# Altium footprint library Package_DFN_QFN.PcbLib: 557 footprints (part 19 of 35)
Each footprint in its own frame and in the unit in brackets; x right, y up, seen from the top. Pads: shape width x height; smd on the part's side, far side on the other; paste and mask are expansions set on the pad; w line width, h text height; cw(c..) or ccw(c..) is an arc to the next point about the centre after c.
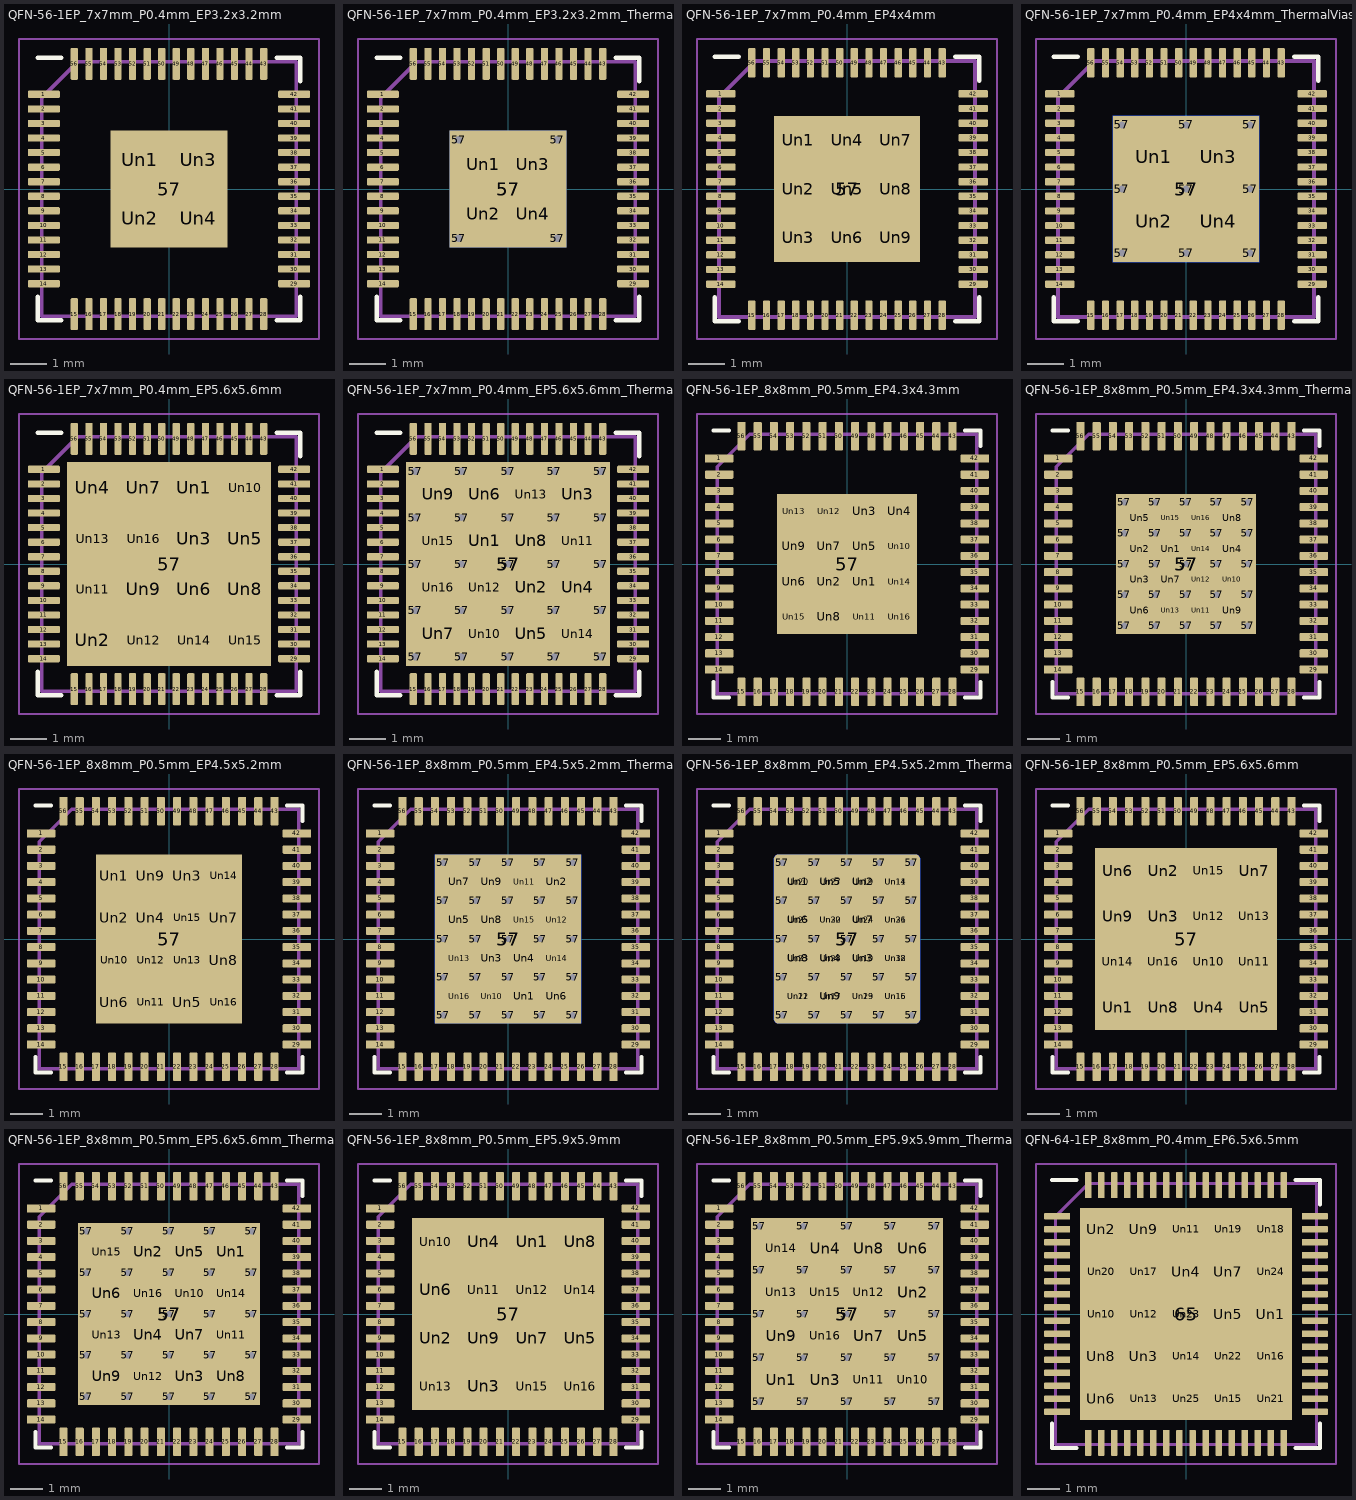
[diagram p18: the footprints below, top view; thin cyan lines are the x and y axes]

## QFN-56-1EP_7x7mm_P0.4mm_EP3.2x3.2mm [mm]
pads (61):
  rrect25% 0.875x0.2 smd: 1(-3.437,2.6) 2(-3.437,2.2) 3(-3.437,1.8) 4(-3.437,1.4) 5(-3.437,1) 6(-3.437,0.6) 7(-3.437,0.2) 8(-3.437,-0.2) 9(-3.437,-0.6) 10(-3.437,-1) 11(-3.437,-1.4) 12(-3.437,-1.8) 13(-3.437,-2.2) 14(-3.437,-2.6) 29(3.437,-2.6) 30(3.437,-2.2) 31(3.437,-1.8) 32(3.437,-1.4) 33(3.437,-1) 34(3.437,-0.6) 35(3.437,-0.2) 36(3.437,0.2) 37(3.437,0.6) 38(3.437,1) 39(3.437,1.4) 40(3.437,1.8) 41(3.437,2.2) 42(3.437,2.6)
  rrect25% 0.2x0.875 smd: 15(-2.6,-3.437) 16(-2.2,-3.437) 17(-1.8,-3.437) 18(-1.4,-3.437) 19(-1,-3.437) 20(-0.6,-3.437) 21(-0.2,-3.437) 22(0.2,-3.437) 23(0.6,-3.437) 24(1,-3.437) 25(1.4,-3.437) 26(1.8,-3.437) 27(2.2,-3.437) 28(2.6,-3.437) 43(2.6,3.437) 44(2.2,3.437) 45(1.8,3.437) 46(1.4,3.437) 47(1,3.437) 48(0.6,3.437) 49(0.2,3.437) 50(-0.2,3.437) 51(-0.6,3.437) 52(-1,3.437) 53(-1.4,3.437) 54(-1.8,3.437) 55(-2.2,3.437) 56(-2.6,3.437)
  rect 3.2x3.2 smd: 57(0,0)
  rrect19% 1.29x1.29 on Top Paste: Un1(-0.8,0.8) Un2(-0.8,-0.8) Un3(0.8,0.8) Un4(0.8,-0.8)
F.SilkS:
  lines w0.12: -3.61,-2.96 -3.61,-3.61 -2.96,-3.61 ; -3.61,3.61 -2.96,3.61 ; 2.96,-3.61 3.61,-3.61 3.61,-2.96 ; 2.96,3.61 3.61,3.61 3.61,2.96
F.CrtYd:
  lines w0.05: -4.12,-4.12 -4.12,4.12 4.12,4.12 4.12,-4.12 -4.12,-4.12
F.Fab:
  lines w0.1: -3.5,-3.5 3.5,-3.5 3.5,3.5 -2.5,3.5 -3.5,2.5 -3.5,-3.5
  text "'.Designator'" at -4.047,-0.84 h1

## QFN-56-1EP_7x7mm_P0.4mm_EP3.2x3.2mm_ThermalVias [mm]
pads (66):
  rrect25% 0.875x0.2 smd: 1(-3.437,2.6) 2(-3.437,2.2) 3(-3.437,1.8) 4(-3.437,1.4) 5(-3.437,1) 6(-3.437,0.6) 7(-3.437,0.2) 8(-3.437,-0.2) 9(-3.437,-0.6) 10(-3.437,-1) 11(-3.437,-1.4) 12(-3.437,-1.8) 13(-3.437,-2.2) 14(-3.437,-2.6) 29(3.437,-2.6) 30(3.437,-2.2) 31(3.437,-1.8) 32(3.437,-1.4) 33(3.437,-1) 34(3.437,-0.6) 35(3.437,-0.2) 36(3.437,0.2) 37(3.437,0.6) 38(3.437,1) 39(3.437,1.4) 40(3.437,1.8) 41(3.437,2.2) 42(3.437,2.6)
  rrect25% 0.2x0.875 smd: 15(-2.6,-3.437) 16(-2.2,-3.437) 17(-1.8,-3.437) 18(-1.4,-3.437) 19(-1,-3.437) 20(-0.6,-3.437) 21(-0.2,-3.437) 22(0.2,-3.437) 23(0.6,-3.437) 24(1,-3.437) 25(1.4,-3.437) 26(1.8,-3.437) 27(2.2,-3.437) 28(2.6,-3.437) 43(2.6,3.437) 44(2.2,3.437) 45(1.8,3.437) 46(1.4,3.437) 47(1,3.437) 48(0.6,3.437) 49(0.2,3.437) 50(-0.2,3.437) 51(-0.6,3.437) 52(-1,3.437) 53(-1.4,3.437) 54(-1.8,3.437) 55(-2.2,3.437) 56(-2.6,3.437)
  round 0.5 hole 0.2: 57(-1.35,-1.35) 57(-1.35,1.35) 57(1.35,-1.35) 57(1.35,1.35)
  rect 3.2x3.2 smd: 57(0,0)
  rect 3.2x3.2 smd far side: 57(0,0)
  round 1.118 on Top Paste: Un1(-0.675,0.675) Un2(-0.675,-0.675) Un3(0.675,0.675) Un4(0.675,-0.675)
F.SilkS:
  lines w0.12: -3.61,-2.96 -3.61,-3.61 -2.96,-3.61 ; -3.61,3.61 -2.96,3.61 ; 2.96,-3.61 3.61,-3.61 3.61,-2.96 ; 2.96,3.61 3.61,3.61 3.61,2.96
F.Paste:
  region: -0.177,0.177 -1.173,0.177 -1.173,1.072 -1.072,1.173 -0.177,1.173
  region: -0.177,-1.173 -1.072,-1.173 -1.173,-1.072 -1.173,-0.177 -0.177,-0.177
  region: 1.173,1.072 1.173,0.177 0.177,0.177 0.177,1.173 1.072,1.173
  region: 1.173,-1.072 1.072,-1.173 0.177,-1.173 0.177,-0.177 1.173,-0.177
F.CrtYd:
  lines w0.05: -4.12,-4.12 -4.12,4.12 4.12,4.12 4.12,-4.12 -4.12,-4.12
F.Fab:
  lines w0.1: -3.5,-3.5 3.5,-3.5 3.5,3.5 -2.5,3.5 -3.5,2.5 -3.5,-3.5
  text "'.Designator'" at -4.047,-0.84 h1

## QFN-56-1EP_7x7mm_P0.4mm_EP4x4mm [mm]
pads (66):
  rrect25% 0.8x0.2 smd: 1(-3.45,2.6) 2(-3.45,2.2) 3(-3.45,1.8) 4(-3.45,1.4) 5(-3.45,1) 6(-3.45,0.6) 7(-3.45,0.2) 8(-3.45,-0.2) 9(-3.45,-0.6) 10(-3.45,-1) 11(-3.45,-1.4) 12(-3.45,-1.8) 13(-3.45,-2.2) 14(-3.45,-2.6) 29(3.45,-2.6) 30(3.45,-2.2) 31(3.45,-1.8) 32(3.45,-1.4) 33(3.45,-1) 34(3.45,-0.6) 35(3.45,-0.2) 36(3.45,0.2) 37(3.45,0.6) 38(3.45,1) 39(3.45,1.4) 40(3.45,1.8) 41(3.45,2.2) 42(3.45,2.6)
  rrect25% 0.2x0.8 smd: 15(-2.6,-3.45) 16(-2.2,-3.45) 17(-1.8,-3.45) 18(-1.4,-3.45) 19(-1,-3.45) 20(-0.6,-3.45) 21(-0.2,-3.45) 22(0.2,-3.45) 23(0.6,-3.45) 24(1,-3.45) 25(1.4,-3.45) 26(1.8,-3.45) 27(2.2,-3.45) 28(2.6,-3.45) 43(2.6,3.45) 44(2.2,3.45) 45(1.8,3.45) 46(1.4,3.45) 47(1,3.45) 48(0.6,3.45) 49(0.2,3.45) 50(-0.2,3.45) 51(-0.6,3.45) 52(-1,3.45) 53(-1.4,3.45) 54(-1.8,3.45) 55(-2.2,3.45) 56(-2.6,3.45)
  rect 4x4 smd: 57(0,0)
  rrect23% 1.07x1.07 on Top Paste: Un1(-1.33,1.33) Un2(-1.33,0) Un3(-1.33,-1.33) Un4(0,1.33) Un5(0,0) Un6(0,-1.33) Un7(1.33,1.33) Un8(1.33,0) Un9(1.33,-1.33)
F.SilkS:
  lines w0.12: -3.61,-2.96 -3.61,-3.61 -2.96,-3.61 ; -3.61,3.61 -2.96,3.61 ; 2.96,-3.61 3.61,-3.61 3.61,-2.96 ; 2.96,3.61 3.61,3.61 3.61,2.96
F.CrtYd:
  lines w0.05: -4.1,-4.1 -4.1,4.1 4.1,4.1 4.1,-4.1 -4.1,-4.1
F.Fab:
  lines w0.1: -3.5,-3.5 3.5,-3.5 3.5,3.5 -2.5,3.5 -3.5,2.5 -3.5,-3.5
  text "'.Designator'" at -4.047,-0.84 h1

## QFN-56-1EP_7x7mm_P0.4mm_EP4x4mm_ThermalVias [mm]
pads (71):
  rrect25% 0.8x0.2 smd: 1(-3.45,2.6) 2(-3.45,2.2) 3(-3.45,1.8) 4(-3.45,1.4) 5(-3.45,1) 6(-3.45,0.6) 7(-3.45,0.2) 8(-3.45,-0.2) 9(-3.45,-0.6) 10(-3.45,-1) 11(-3.45,-1.4) 12(-3.45,-1.8) 13(-3.45,-2.2) 14(-3.45,-2.6) 29(3.45,-2.6) 30(3.45,-2.2) 31(3.45,-1.8) 32(3.45,-1.4) 33(3.45,-1) 34(3.45,-0.6) 35(3.45,-0.2) 36(3.45,0.2) 37(3.45,0.6) 38(3.45,1) 39(3.45,1.4) 40(3.45,1.8) 41(3.45,2.2) 42(3.45,2.6)
  rrect25% 0.2x0.8 smd: 15(-2.6,-3.45) 16(-2.2,-3.45) 17(-1.8,-3.45) 18(-1.4,-3.45) 19(-1,-3.45) 20(-0.6,-3.45) 21(-0.2,-3.45) 22(0.2,-3.45) 23(0.6,-3.45) 24(1,-3.45) 25(1.4,-3.45) 26(1.8,-3.45) 27(2.2,-3.45) 28(2.6,-3.45) 43(2.6,3.45) 44(2.2,3.45) 45(1.8,3.45) 46(1.4,3.45) 47(1,3.45) 48(0.6,3.45) 49(0.2,3.45) 50(-0.2,3.45) 51(-0.6,3.45) 52(-1,3.45) 53(-1.4,3.45) 54(-1.8,3.45) 55(-2.2,3.45) 56(-2.6,3.45)
  round 0.5 hole 0.2: 57(-1.75,-1.75) 57(-1.75,0) 57(-1.75,1.75) 57(0,-1.75) 57(0,0) 57(0,1.75) 57(1.75,-1.75) 57(1.75,0) 57(1.75,1.75)
  rect 4x4 smd: 57(0,0)
  rect 4x4 smd far side: 57(0,0)
  rrect16% 1.549x1.549 on Top Paste: Un1(-0.875,0.875) Un2(-0.875,-0.875) Un3(0.875,0.875) Un4(0.875,-0.875)
F.SilkS:
  lines w0.12: -3.61,-2.96 -3.61,-3.61 -2.96,-3.61 ; -3.61,3.61 -2.96,3.61 ; 2.96,-3.61 3.61,-3.61 3.61,-2.96 ; 2.96,3.61 3.61,3.61 3.61,2.96
F.CrtYd:
  lines w0.05: -4.1,-4.1 -4.1,4.1 4.1,4.1 4.1,-4.1 -4.1,-4.1
F.Fab:
  lines w0.1: -3.5,-3.5 3.5,-3.5 3.5,3.5 -2.5,3.5 -3.5,2.5 -3.5,-3.5
  text "'.Designator'" at -4.047,-0.84 h1

## QFN-56-1EP_7x7mm_P0.4mm_EP5.6x5.6mm [mm]
pads (73):
  rrect25% 0.875x0.2 smd: 1(-3.437,2.6) 2(-3.437,2.2) 3(-3.437,1.8) 4(-3.437,1.4) 5(-3.437,1) 6(-3.437,0.6) 7(-3.437,0.2) 8(-3.437,-0.2) 9(-3.437,-0.6) 10(-3.437,-1) 11(-3.437,-1.4) 12(-3.437,-1.8) 13(-3.437,-2.2) 14(-3.437,-2.6) 29(3.437,-2.6) 30(3.437,-2.2) 31(3.437,-1.8) 32(3.437,-1.4) 33(3.437,-1) 34(3.437,-0.6) 35(3.437,-0.2) 36(3.437,0.2) 37(3.437,0.6) 38(3.437,1) 39(3.437,1.4) 40(3.437,1.8) 41(3.437,2.2) 42(3.437,2.6)
  rrect25% 0.2x0.875 smd: 15(-2.6,-3.437) 16(-2.2,-3.437) 17(-1.8,-3.437) 18(-1.4,-3.437) 19(-1,-3.437) 20(-0.6,-3.437) 21(-0.2,-3.437) 22(0.2,-3.437) 23(0.6,-3.437) 24(1,-3.437) 25(1.4,-3.437) 26(1.8,-3.437) 27(2.2,-3.437) 28(2.6,-3.437) 43(2.6,3.437) 44(2.2,3.437) 45(1.8,3.437) 46(1.4,3.437) 47(1,3.437) 48(0.6,3.437) 49(0.2,3.437) 50(-0.2,3.437) 51(-0.6,3.437) 52(-1,3.437) 53(-1.4,3.437) 54(-1.8,3.437) 55(-2.2,3.437) 56(-2.6,3.437)
  rect 5.6x5.6 smd: 57(0,0)
  rrect22% 1.13x1.13 on Top Paste: Un1(0.7,2.1) Un2(-2.1,-2.1) Un3(0.7,0.7) Un4(-2.1,2.1) Un5(2.1,0.7) Un6(0.7,-0.7) Un7(-0.7,2.1) Un8(2.1,-0.7) Un9(-0.7,-0.7) Un10(2.1,2.1) Un11(-2.1,-0.7) Un12(-0.7,-2.1) Un13(-2.1,0.7) Un14(0.7,-2.1) Un15(2.1,-2.1) Un16(-0.7,0.7)
F.SilkS:
  lines w0.12: -3.61,-2.96 -3.61,-3.61 -2.96,-3.61 ; -3.61,3.61 -2.96,3.61 ; 2.96,-3.61 3.61,-3.61 3.61,-2.96 ; 2.96,3.61 3.61,3.61 3.61,2.96
F.CrtYd:
  lines w0.05: -4.12,-4.12 4.12,-4.12 4.12,4.12 -4.12,4.12 -4.12,-4.12
F.Fab:
  lines w0.1: -3.5,-3.5 3.5,-3.5 3.5,3.5 -2.5,3.5 -3.5,2.5 -3.5,-3.5
  text "'.Designator'" at -4.047,-0.84 h1

## QFN-56-1EP_7x7mm_P0.4mm_EP5.6x5.6mm_ThermalVias [mm]
pads (99):
  rrect25% 0.875x0.2 smd: 1(-3.437,2.6) 2(-3.437,2.2) 3(-3.437,1.8) 4(-3.437,1.4) 5(-3.437,1) 6(-3.437,0.6) 7(-3.437,0.2) 8(-3.437,-0.2) 9(-3.437,-0.6) 10(-3.437,-1) 11(-3.437,-1.4) 12(-3.437,-1.8) 13(-3.437,-2.2) 14(-3.437,-2.6) 29(3.437,-2.6) 30(3.437,-2.2) 31(3.437,-1.8) 32(3.437,-1.4) 33(3.437,-1) 34(3.437,-0.6) 35(3.437,-0.2) 36(3.437,0.2) 37(3.437,0.6) 38(3.437,1) 39(3.437,1.4) 40(3.437,1.8) 41(3.437,2.2) 42(3.437,2.6)
  rrect25% 0.2x0.875 smd: 15(-2.6,-3.437) 16(-2.2,-3.437) 17(-1.8,-3.437) 18(-1.4,-3.437) 19(-1,-3.437) 20(-0.6,-3.437) 21(-0.2,-3.437) 22(0.2,-3.437) 23(0.6,-3.437) 24(1,-3.437) 25(1.4,-3.437) 26(1.8,-3.437) 27(2.2,-3.437) 28(2.6,-3.437) 43(2.6,3.437) 44(2.2,3.437) 45(1.8,3.437) 46(1.4,3.437) 47(1,3.437) 48(0.6,3.437) 49(0.2,3.437) 50(-0.2,3.437) 51(-0.6,3.437) 52(-1,3.437) 53(-1.4,3.437) 54(-1.8,3.437) 55(-2.2,3.437) 56(-2.6,3.437)
  round 0.5 hole 0.2: 57(-2.55,-2.55) 57(-2.55,-1.275) 57(-2.55,0) 57(-2.55,1.275) 57(-2.55,2.55) 57(-1.275,-2.55) 57(-1.275,-1.275) 57(-1.275,0) 57(-1.275,1.275) 57(-1.275,2.55) 57(0,-2.55) 57(0,-1.275) 57(0,0) 57(0,1.275) 57(0,2.55) 57(1.275,-2.55) 57(1.275,-1.275) 57(1.275,0) 57(1.275,1.275) 57(1.275,2.55) 57(2.55,-2.55) 57(2.55,-1.275) 57(2.55,0) 57(2.55,1.275) 57(2.55,2.55)
  rect 5.6x5.6 smd far side: 57(0,0)
  rect 5.6x5.6 smd: 57(0,0)
  rrect23% 1.084x1.084 on Top Paste: Un1(-0.637,0.637) Un2(0.637,-0.637) Un3(1.913,1.913) Un4(1.913,-0.637) Un5(0.637,-1.913) Un6(-0.637,1.913) Un7(-1.913,-1.913) Un8(0.637,0.637) Un9(-1.913,1.913) Un10(-0.637,-1.913) Un11(1.913,0.637) Un12(-0.637,-0.637) Un13(0.637,1.913) Un14(1.913,-1.913) Un15(-1.913,0.637) Un16(-1.913,-0.637)
F.SilkS:
  lines w0.12: -3.61,-2.96 -3.61,-3.61 -2.96,-3.61 ; -3.61,3.61 -2.96,3.61 ; 2.96,-3.61 3.61,-3.61 3.61,-2.96 ; 2.96,3.61 3.61,3.61 3.61,2.96
F.CrtYd:
  lines w0.05: -4.12,-4.12 -4.12,4.12 4.12,4.12 4.12,-4.12 -4.12,-4.12
F.Fab:
  lines w0.1: -3.5,-3.5 3.5,-3.5 3.5,3.5 -2.5,3.5 -3.5,2.5 -3.5,-3.5
  text "'.Designator'" at -4.047,-0.84 h1

## QFN-56-1EP_8x8mm_P0.5mm_EP4.3x4.3mm [mm]
pads (73):
  rrect25% 0.875x0.25 smd: 1(-3.938,3.25) 2(-3.938,2.75) 3(-3.938,2.25) 4(-3.938,1.75) 5(-3.938,1.25) 6(-3.938,0.75) 7(-3.938,0.25) 8(-3.938,-0.25) 9(-3.938,-0.75) 10(-3.938,-1.25) 11(-3.938,-1.75) 12(-3.938,-2.25) 13(-3.938,-2.75) 14(-3.938,-3.25) 29(3.938,-3.25) 30(3.938,-2.75) 31(3.938,-2.25) 32(3.938,-1.75) 33(3.938,-1.25) 34(3.938,-0.75) 35(3.938,-0.25) 36(3.938,0.25) 37(3.938,0.75) 38(3.938,1.25) 39(3.938,1.75) 40(3.938,2.25) 41(3.938,2.75) 42(3.938,3.25)
  rrect25% 0.25x0.875 smd: 15(-3.25,-3.938) 16(-2.75,-3.938) 17(-2.25,-3.938) 18(-1.75,-3.938) 19(-1.25,-3.938) 20(-0.75,-3.938) 21(-0.25,-3.938) 22(0.25,-3.938) 23(0.75,-3.938) 24(1.25,-3.938) 25(1.75,-3.938) 26(2.25,-3.938) 27(2.75,-3.938) 28(3.25,-3.938) 43(3.25,3.938) 44(2.75,3.938) 45(2.25,3.938) 46(1.75,3.938) 47(1.25,3.938) 48(0.75,3.938) 49(0.25,3.938) 50(-0.25,3.938) 51(-0.75,3.938) 52(-1.25,3.938) 53(-1.75,3.938) 54(-2.25,3.938) 55(-2.75,3.938) 56(-3.25,3.938)
  rect 4.3x4.3 smd: 57(0,0)
  rrect25% 0.87x0.87 on Top Paste: Un1(0.54,-0.54) Un2(-0.54,-0.54) Un3(0.54,1.62) Un4(1.62,1.62) Un5(0.54,0.54) Un6(-1.62,-0.54) Un7(-0.54,0.54) Un8(-0.54,-1.62) Un9(-1.62,0.54) Un10(1.62,0.54) Un11(0.54,-1.62) Un12(-0.54,1.62) Un13(-1.62,1.62) Un14(1.62,-0.54) Un15(-1.62,-1.62) Un16(1.62,-1.62)
F.SilkS:
  lines w0.12: -4.11,-3.635 -4.11,-4.11 -3.635,-4.11 ; -4.11,4.11 -3.635,4.11 ; 3.635,-4.11 4.11,-4.11 4.11,-3.635 ; 3.635,4.11 4.11,4.11 4.11,3.635
F.CrtYd:
  lines w0.05: -4.62,-4.62 4.62,-4.62 4.62,4.62 -4.62,4.62 -4.62,-4.62
F.Fab:
  lines w0.1: -4,-4 4,-4 4,4 -3,4 -4,3 -4,-4
  text "'.Designator'" at -4.047,-0.84 h1

## QFN-56-1EP_8x8mm_P0.5mm_EP4.3x4.3mm_ThermalVias [mm]
pads (99):
  rrect25% 0.875x0.25 smd: 1(-3.938,3.25) 2(-3.938,2.75) 3(-3.938,2.25) 4(-3.938,1.75) 5(-3.938,1.25) 6(-3.938,0.75) 7(-3.938,0.25) 8(-3.938,-0.25) 9(-3.938,-0.75) 10(-3.938,-1.25) 11(-3.938,-1.75) 12(-3.938,-2.25) 13(-3.938,-2.75) 14(-3.938,-3.25) 29(3.938,-3.25) 30(3.938,-2.75) 31(3.938,-2.25) 32(3.938,-1.75) 33(3.938,-1.25) 34(3.938,-0.75) 35(3.938,-0.25) 36(3.938,0.25) 37(3.938,0.75) 38(3.938,1.25) 39(3.938,1.75) 40(3.938,2.25) 41(3.938,2.75) 42(3.938,3.25)
  rrect25% 0.25x0.875 smd: 15(-3.25,-3.938) 16(-2.75,-3.938) 17(-2.25,-3.938) 18(-1.75,-3.938) 19(-1.25,-3.938) 20(-0.75,-3.938) 21(-0.25,-3.938) 22(0.25,-3.938) 23(0.75,-3.938) 24(1.25,-3.938) 25(1.75,-3.938) 26(2.25,-3.938) 27(2.75,-3.938) 28(3.25,-3.938) 43(3.25,3.938) 44(2.75,3.938) 45(2.25,3.938) 46(1.75,3.938) 47(1.25,3.938) 48(0.75,3.938) 49(0.25,3.938) 50(-0.25,3.938) 51(-0.75,3.938) 52(-1.25,3.938) 53(-1.75,3.938) 54(-2.25,3.938) 55(-2.75,3.938) 56(-3.25,3.938)
  round 0.5 hole 0.2: 57(-1.9,-1.9) 57(-1.9,-0.95) 57(-1.9,0) 57(-1.9,0.95) 57(-1.9,1.9) 57(-0.95,-1.9) 57(-0.95,-0.95) 57(-0.95,0) 57(-0.95,0.95) 57(-0.95,1.9) 57(0,-1.9) 57(0,-0.95) 57(0,0) 57(0,0.95) 57(0,1.9) 57(0.95,-1.9) 57(0.95,-0.95) 57(0.95,0) 57(0.95,0.95) 57(0.95,1.9) 57(1.9,-1.9) 57(1.9,-0.95) 57(1.9,0) 57(1.9,0.95) 57(1.9,1.9)
  rect 4.3x4.3 smd far side: 57(0,0)
  rect 4.3x4.3 smd: 57(0,0)
  round 0.716 on Top Paste: Un1(-0.475,0.475) Un2(-1.425,0.475) Un3(-1.425,-0.475) Un4(1.425,0.475) Un5(-1.425,1.425) Un6(-1.425,-1.425) Un7(-0.475,-0.475) Un8(1.425,1.425) Un9(1.425,-1.425) Un10(1.425,-0.475) Un11(0.475,-1.425) Un12(0.475,-0.475) Un13(-0.475,-1.425) Un14(0.475,0.475) Un15(-0.475,1.425) Un16(0.475,1.425)
F.SilkS:
  lines w0.12: -4.11,-3.635 -4.11,-4.11 -3.635,-4.11 ; -4.11,4.11 -3.635,4.11 ; 3.635,-4.11 4.11,-4.11 4.11,-3.635 ; 3.635,4.11 4.11,4.11 4.11,3.635
F.Paste:
  region: -0.176,0.677 -0.176,0.273 -0.273,0.176 -0.677,0.176 -0.774,0.273 -0.774,0.677 -0.677,0.774 -0.273,0.774
  region: -1.126,0.677 -1.126,0.273 -1.223,0.176 -1.627,0.176 -1.724,0.273 -1.724,0.677 -1.627,0.774 -1.223,0.774
  region: -1.126,-0.273 -1.126,-0.677 -1.223,-0.774 -1.627,-0.774 -1.724,-0.677 -1.724,-0.273 -1.627,-0.176 -1.223,-0.176
  region: 1.724,0.677 1.724,0.273 1.627,0.176 1.223,0.176 1.126,0.273 1.126,0.677 1.223,0.774 1.627,0.774
  region: -1.126,1.627 -1.126,1.223 -1.223,1.126 -1.627,1.126 -1.724,1.223 -1.724,1.627 -1.627,1.724 -1.223,1.724
  region: -1.126,-1.223 -1.126,-1.627 -1.223,-1.724 -1.627,-1.724 -1.724,-1.627 -1.724,-1.223 -1.627,-1.126 -1.223,-1.126
  region: -0.176,-0.273 -0.176,-0.677 -0.273,-0.774 -0.677,-0.774 -0.774,-0.677 -0.774,-0.273 -0.677,-0.176 -0.273,-0.176
  region: 1.724,1.627 1.724,1.223 1.627,1.126 1.223,1.126 1.126,1.223 1.126,1.627 1.223,1.724 1.627,1.724
  region: 1.724,-1.223 1.724,-1.627 1.627,-1.724 1.223,-1.724 1.126,-1.627 1.126,-1.223 1.223,-1.126 1.627,-1.126
  region: 1.724,-0.273 1.724,-0.677 1.627,-0.774 1.223,-0.774 1.126,-0.677 1.126,-0.273 1.223,-0.176 1.627,-0.176
  region: 0.774,-1.223 0.774,-1.627 0.677,-1.724 0.273,-1.724 0.176,-1.627 0.176,-1.223 0.273,-1.126 0.677,-1.126
  region: 0.774,-0.273 0.774,-0.677 0.677,-0.774 0.273,-0.774 0.176,-0.677 0.176,-0.273 0.273,-0.176 0.677,-0.176
  region: -0.176,-1.223 -0.176,-1.627 -0.273,-1.724 -0.677,-1.724 -0.774,-1.627 -0.774,-1.223 -0.677,-1.126 -0.273,-1.126
  region: 0.774,0.677 0.774,0.273 0.677,0.176 0.273,0.176 0.176,0.273 0.176,0.677 0.273,0.774 0.677,0.774
  region: -0.176,1.627 -0.176,1.223 -0.273,1.126 -0.677,1.126 -0.774,1.223 -0.774,1.627 -0.677,1.724 -0.273,1.724
  region: 0.774,1.627 0.774,1.223 0.677,1.126 0.273,1.126 0.176,1.223 0.176,1.627 0.273,1.724 0.677,1.724
F.CrtYd:
  lines w0.05: -4.62,-4.62 -4.62,4.62 4.62,4.62 4.62,-4.62 -4.62,-4.62
F.Fab:
  lines w0.1: -4,-4 -4,3 -3,4 4,4 4,-4 -4,-4
  text "'.Designator'" at -4.047,-0.84 h1

## QFN-56-1EP_8x8mm_P0.5mm_EP4.5x5.2mm [mm]
pads (73):
  rrect25% 0.875x0.25 smd: 1(-3.938,3.25) 2(-3.938,2.75) 3(-3.938,2.25) 4(-3.938,1.75) 5(-3.938,1.25) 6(-3.938,0.75) 7(-3.938,0.25) 8(-3.938,-0.25) 9(-3.938,-0.75) 10(-3.938,-1.25) 11(-3.938,-1.75) 12(-3.938,-2.25) 13(-3.938,-2.75) 14(-3.938,-3.25) 29(3.938,-3.25) 30(3.938,-2.75) 31(3.938,-2.25) 32(3.938,-1.75) 33(3.938,-1.25) 34(3.938,-0.75) 35(3.938,-0.25) 36(3.938,0.25) 37(3.938,0.75) 38(3.938,1.25) 39(3.938,1.75) 40(3.938,2.25) 41(3.938,2.75) 42(3.938,3.25)
  rrect25% 0.25x0.875 smd: 15(-3.25,-3.938) 16(-2.75,-3.938) 17(-2.25,-3.938) 18(-1.75,-3.938) 19(-1.25,-3.938) 20(-0.75,-3.938) 21(-0.25,-3.938) 22(0.25,-3.938) 23(0.75,-3.938) 24(1.25,-3.938) 25(1.75,-3.938) 26(2.25,-3.938) 27(2.75,-3.938) 28(3.25,-3.938) 43(3.25,3.938) 44(2.75,3.938) 45(2.25,3.938) 46(1.75,3.938) 47(1.25,3.938) 48(0.75,3.938) 49(0.25,3.938) 50(-0.25,3.938) 51(-0.75,3.938) 52(-1.25,3.938) 53(-1.75,3.938) 54(-2.25,3.938) 55(-2.75,3.938) 56(-3.25,3.938)
  rect 4.5x5.2 smd: 57(0,0)
  rrect25% 0.91x1.05 on Top Paste: Un1(-1.68,1.95) Un2(-1.68,0.65) Un3(0.56,1.95) Un4(-0.56,0.65) Un5(0.56,-1.95) Un6(-1.68,-1.95) Un7(1.68,0.65) Un8(1.68,-0.65) Un9(-0.56,1.95) Un10(-1.68,-0.65) Un11(-0.56,-1.95) Un12(-0.56,-0.65) Un13(0.56,-0.65) Un14(1.68,1.95) Un15(0.56,0.65) Un16(1.68,-1.95)
F.SilkS:
  lines w0.12: -4.11,-3.635 -4.11,-4.11 -3.635,-4.11 ; -4.11,4.11 -3.635,4.11 ; 3.635,-4.11 4.11,-4.11 4.11,-3.635 ; 3.635,4.11 4.11,4.11 4.11,3.635
F.CrtYd:
  lines w0.05: -4.62,-4.62 -4.62,4.62 4.62,4.62 4.62,-4.62 -4.62,-4.62
F.Fab:
  lines w0.1: -4,-4 -4,3 -3,4 4,4 4,-4 -4,-4
  text "'.Designator'" at -4.047,-0.84 h1

## QFN-56-1EP_8x8mm_P0.5mm_EP4.5x5.2mm_ThermalVias [mm]
pads (99):
  rrect25% 0.875x0.25 smd: 1(-3.938,3.25) 2(-3.938,2.75) 3(-3.938,2.25) 4(-3.938,1.75) 5(-3.938,1.25) 6(-3.938,0.75) 7(-3.938,0.25) 8(-3.938,-0.25) 9(-3.938,-0.75) 10(-3.938,-1.25) 11(-3.938,-1.75) 12(-3.938,-2.25) 13(-3.938,-2.75) 14(-3.938,-3.25) 29(3.938,-3.25) 30(3.938,-2.75) 31(3.938,-2.25) 32(3.938,-1.75) 33(3.938,-1.25) 34(3.938,-0.75) 35(3.938,-0.25) 36(3.938,0.25) 37(3.938,0.75) 38(3.938,1.25) 39(3.938,1.75) 40(3.938,2.25) 41(3.938,2.75) 42(3.938,3.25)
  rrect25% 0.25x0.875 smd: 15(-3.25,-3.938) 16(-2.75,-3.938) 17(-2.25,-3.938) 18(-1.75,-3.938) 19(-1.25,-3.938) 20(-0.75,-3.938) 21(-0.25,-3.938) 22(0.25,-3.938) 23(0.75,-3.938) 24(1.25,-3.938) 25(1.75,-3.938) 26(2.25,-3.938) 27(2.75,-3.938) 28(3.25,-3.938) 43(3.25,3.938) 44(2.75,3.938) 45(2.25,3.938) 46(1.75,3.938) 47(1.25,3.938) 48(0.75,3.938) 49(0.25,3.938) 50(-0.25,3.938) 51(-0.75,3.938) 52(-1.25,3.938) 53(-1.75,3.938) 54(-2.25,3.938) 55(-2.75,3.938) 56(-3.25,3.938)
  round 0.5 hole 0.2: 57(-2,-2.35) 57(-2,-1.175) 57(-2,0) 57(-2,1.175) 57(-2,2.35) 57(-1,-2.35) 57(-1,-1.175) 57(-1,0) 57(-1,1.175) 57(-1,2.35) 57(0,-2.35) 57(0,-1.175) 57(0,0) 57(0,1.175) 57(0,2.35) 57(1,-2.35) 57(1,-1.175) 57(1,0) 57(1,1.175) 57(1,2.35) 57(2,-2.35) 57(2,-1.175) 57(2,0) 57(2,1.175) 57(2,2.35)
  rect 4.5x5.2 smd far side: 57(0,0)
  rect 4.5x5.2 smd: 57(0,0)
  round 0.776 on Top Paste: Un1(0.5,-1.763) Un2(1.5,1.763) Un3(-0.5,-0.587) Un4(0.5,-0.587) Un5(-1.5,0.587) Un6(1.5,-1.763) Un7(-1.5,1.763) Un8(-0.5,0.587) Un9(-0.5,1.763) Un10(-0.5,-1.763) Un11(0.5,1.763) Un12(1.5,0.587) Un13(-1.5,-0.587) Un14(1.5,-0.587) Un15(0.5,0.587) Un16(-1.5,-1.763)
F.SilkS:
  lines w0.12: -4.11,-3.635 -4.11,-4.11 -3.635,-4.11 ; -4.11,4.11 -3.635,4.11 ; 3.635,-4.11 4.11,-4.11 4.11,-3.635 ; 3.635,4.11 4.11,4.11 4.11,3.635
F.Paste:
  region: 0.841,-1.433 0.841,-2.092 0.762,-2.171 0.238,-2.171 0.159,-2.092 0.159,-1.433 0.238,-1.354 0.762,-1.354
  region: 1.841,2.092 1.841,1.433 1.762,1.354 1.238,1.354 1.159,1.433 1.159,2.092 1.238,2.171 1.762,2.171
  region: -0.159,-0.258 -0.159,-0.917 -0.238,-0.996 -0.762,-0.996 -0.841,-0.917 -0.841,-0.258 -0.762,-0.179 -0.238,-0.179
  region: 0.841,-0.258 0.841,-0.917 0.762,-0.996 0.238,-0.996 0.159,-0.917 0.159,-0.258 0.238,-0.179 0.762,-0.179
  region: -1.159,0.917 -1.159,0.258 -1.238,0.179 -1.762,0.179 -1.841,0.258 -1.841,0.917 -1.762,0.996 -1.238,0.996
  region: 1.841,-1.433 1.841,-2.092 1.762,-2.171 1.238,-2.171 1.159,-2.092 1.159,-1.433 1.238,-1.354 1.762,-1.354
  region: -1.159,2.092 -1.159,1.433 -1.238,1.354 -1.762,1.354 -1.841,1.433 -1.841,2.092 -1.762,2.171 -1.238,2.171
  region: -0.159,0.917 -0.159,0.258 -0.238,0.179 -0.762,0.179 -0.841,0.258 -0.841,0.917 -0.762,0.996 -0.238,0.996
  region: -0.159,2.092 -0.159,1.433 -0.238,1.354 -0.762,1.354 -0.841,1.433 -0.841,2.092 -0.762,2.171 -0.238,2.171
  region: -0.159,-1.433 -0.159,-2.092 -0.238,-2.171 -0.762,-2.171 -0.841,-2.092 -0.841,-1.433 -0.762,-1.354 -0.238,-1.354
  region: 0.841,2.092 0.841,1.433 0.762,1.354 0.238,1.354 0.159,1.433 0.159,2.092 0.238,2.171 0.762,2.171
  region: 1.841,0.917 1.841,0.258 1.762,0.179 1.238,0.179 1.159,0.258 1.159,0.917 1.238,0.996 1.762,0.996
  region: -1.159,-0.258 -1.159,-0.917 -1.238,-0.996 -1.762,-0.996 -1.841,-0.917 -1.841,-0.258 -1.762,-0.179 -1.238,-0.179
  region: 1.841,-0.258 1.841,-0.917 1.762,-0.996 1.238,-0.996 1.159,-0.917 1.159,-0.258 1.238,-0.179 1.762,-0.179
  region: 0.841,0.917 0.841,0.258 0.762,0.179 0.238,0.179 0.159,0.258 0.159,0.917 0.238,0.996 0.762,0.996
  region: -1.159,-1.433 -1.159,-2.092 -1.238,-2.171 -1.762,-2.171 -1.841,-2.092 -1.841,-1.433 -1.762,-1.354 -1.238,-1.354
F.CrtYd:
  lines w0.05: -4.62,-4.62 4.62,-4.62 4.62,4.62 -4.62,4.62 -4.62,-4.62
F.Fab:
  lines w0.1: -4,-4 -4,3 -3,4 4,4 4,-4 -4,-4
  text "'.Designator'" at -4.047,-0.84 h1

## QFN-56-1EP_8x8mm_P0.5mm_EP4.5x5.2mm_ThermalVias_TopTented [mm]
pads (115):
  rrect25% 0.875x0.25 smd: 1(-3.938,3.25) 2(-3.938,2.75) 3(-3.938,2.25) 4(-3.938,1.75) 5(-3.938,1.25) 6(-3.938,0.75) 7(-3.938,0.25) 8(-3.938,-0.25) 9(-3.938,-0.75) 10(-3.938,-1.25) 11(-3.938,-1.75) 12(-3.938,-2.25) 13(-3.938,-2.75) 14(-3.938,-3.25) 29(3.938,-3.25) 30(3.938,-2.75) 31(3.938,-2.25) 32(3.938,-1.75) 33(3.938,-1.25) 34(3.938,-0.75) 35(3.938,-0.25) 36(3.938,0.25) 37(3.938,0.75) 38(3.938,1.25) 39(3.938,1.75) 40(3.938,2.25) 41(3.938,2.75) 42(3.938,3.25)
  rrect25% 0.25x0.875 smd: 15(-3.25,-3.938) 16(-2.75,-3.938) 17(-2.25,-3.938) 18(-1.75,-3.938) 19(-1.25,-3.938) 20(-0.75,-3.938) 21(-0.25,-3.938) 22(0.25,-3.938) 23(0.75,-3.938) 24(1.25,-3.938) 25(1.75,-3.938) 26(2.25,-3.938) 27(2.75,-3.938) 28(3.25,-3.938) 43(3.25,3.938) 44(2.75,3.938) 45(2.25,3.938) 46(1.75,3.938) 47(1.25,3.938) 48(0.75,3.938) 49(0.25,3.938) 50(-0.25,3.938) 51(-0.75,3.938) 52(-1.25,3.938) 53(-1.75,3.938) 54(-2.25,3.938) 55(-2.75,3.938) 56(-3.25,3.938)
  round 0.5 hole 0.2: 57(-2,-2.35) 57(-2,-1.175) 57(-2,0) 57(-2,1.175) 57(-2,2.35) 57(-1,-2.35) 57(-1,-1.175) 57(-1,0) 57(-1,1.175) 57(-1,2.35) 57(0,-2.35) 57(0,-1.175) 57(0,0) 57(0,1.175) 57(0,2.35) 57(1,-2.35) 57(1,-1.175) 57(1,0) 57(1,1.175) 57(1,2.35) 57(2,-2.35) 57(2,-1.175) 57(2,0) 57(2,1.175) 57(2,2.35)
  rrect6% 4.5x5.2 smd: 57(0,0)
  rrect6% 4.5x5.2 smd far side: 57(0,0)
  round 0.776 on Top Paste: Un1(-1.5,1.763) Un2(0.5,1.763) Un3(0.5,-0.587) Un4(-0.5,-0.587) Un5(-0.5,1.763) Un6(-1.5,0.587) Un7(0.5,0.587) Un9(-0.5,-1.763) Un12(-1.5,-1.763) Un14(1.5,1.763) Un16(1.5,-1.763) Un18(1.5,-0.587) Un23(-1.5,-0.587) Un29(0.5,-1.763) Un30(-0.5,0.587) Un31(1.5,0.587)
  round 0.776 on Top Solder: Un8(-1.5,-0.587) Un10(0.5,-0.587) Un11(1.5,1.763) Un13(0.5,-1.763) Un15(1.5,-1.763) Un17(-0.5,-1.763) Un19(0.5,1.763) Un20(-1.5,1.763) Un21(-1.5,-1.763) Un22(-0.5,0.587) Un24(0.5,0.587) Un25(-1.5,0.587) Un26(1.5,0.587) Un27(-0.5,1.763) Un28(-0.5,-0.587) Un32(1.5,-0.587)
F.SilkS:
  lines w0.12: -4.11,-3.635 -4.11,-4.11 -3.635,-4.11 ; -4.11,4.11 -3.635,4.11 ; 3.635,-4.11 4.11,-4.11 4.11,-3.635 ; 3.635,4.11 4.11,4.11 4.11,3.635
F.Paste:
  region: -1.065,2.12 -1.065,1.405 -1.21,1.26 -1.79,1.26 -1.935,1.405 -1.935,2.12 -1.79,2.265 -1.21,2.265
  region: 0.935,2.12 0.935,1.405 0.79,1.26 0.21,1.26 0.065,1.405 0.065,2.12 0.21,2.265 0.79,2.265
  region: 0.935,-0.23 0.935,-0.945 0.79,-1.09 0.21,-1.09 0.065,-0.945 0.065,-0.23 0.21,-0.085 0.79,-0.085
  region: -0.065,-0.23 -0.065,-0.945 -0.21,-1.09 -0.79,-1.09 -0.935,-0.945 -0.935,-0.23 -0.79,-0.085 -0.21,-0.085
  region: -0.065,2.12 -0.065,1.405 -0.21,1.26 -0.79,1.26 -0.935,1.405 -0.935,2.12 -0.79,2.265 -0.21,2.265
  region: -1.065,0.945 -1.065,0.23 -1.21,0.085 -1.79,0.085 -1.935,0.23 -1.935,0.945 -1.79,1.09 -1.21,1.09
  region: 0.935,0.945 0.935,0.23 0.79,0.085 0.21,0.085 0.065,0.23 0.065,0.945 0.21,1.09 0.79,1.09
  region: -0.065,-1.405 -0.065,-2.12 -0.21,-2.265 -0.79,-2.265 -0.935,-2.12 -0.935,-1.405 -0.79,-1.26 -0.21,-1.26
  region: -1.065,-1.405 -1.065,-2.12 -1.21,-2.265 -1.79,-2.265 -1.935,-2.12 -1.935,-1.405 -1.79,-1.26 -1.21,-1.26
  region: 1.935,2.12 1.935,1.405 1.79,1.26 1.21,1.26 1.065,1.405 1.065,2.12 1.21,2.265 1.79,2.265
  region: 1.935,-1.405 1.935,-2.12 1.79,-2.265 1.21,-2.265 1.065,-2.12 1.065,-1.405 1.21,-1.26 1.79,-1.26
  region: 1.935,-0.23 1.935,-0.945 1.79,-1.09 1.21,-1.09 1.065,-0.945 1.065,-0.23 1.21,-0.085 1.79,-0.085
  region: -1.065,-0.23 -1.065,-0.945 -1.21,-1.09 -1.79,-1.09 -1.935,-0.945 -1.935,-0.23 -1.79,-0.085 -1.21,-0.085
  region: 0.935,-1.405 0.935,-2.12 0.79,-2.265 0.21,-2.265 0.065,-2.12 0.065,-1.405 0.21,-1.26 0.79,-1.26
  region: -0.065,0.945 -0.065,0.23 -0.21,0.085 -0.79,0.085 -0.935,0.23 -0.935,0.945 -0.79,1.09 -0.21,1.09
  region: 1.935,0.945 1.935,0.23 1.79,0.085 1.21,0.085 1.065,0.23 1.065,0.945 1.21,1.09 1.79,1.09
F.Mask:
  drawing of 80 lines, arcs and shapes, not listed
F.CrtYd:
  lines w0.05: -4.62,-4.62 -4.62,4.62 4.62,4.62 4.62,-4.62 -4.62,-4.62
F.Fab:
  lines w0.1: -4,-4 4,-4 4,4 -3,4 -4,3 -4,-4
  text "'.Designator'" at -4.047,-0.84 h1

## QFN-56-1EP_8x8mm_P0.5mm_EP5.6x5.6mm [mm]
pads (73):
  rrect25% 0.875x0.25 smd: 1(-3.938,3.25) 2(-3.938,2.75) 3(-3.938,2.25) 4(-3.938,1.75) 5(-3.938,1.25) 6(-3.938,0.75) 7(-3.938,0.25) 8(-3.938,-0.25) 9(-3.938,-0.75) 10(-3.938,-1.25) 11(-3.938,-1.75) 12(-3.938,-2.25) 13(-3.938,-2.75) 14(-3.938,-3.25) 29(3.938,-3.25) 30(3.938,-2.75) 31(3.938,-2.25) 32(3.938,-1.75) 33(3.938,-1.25) 34(3.938,-0.75) 35(3.938,-0.25) 36(3.938,0.25) 37(3.938,0.75) 38(3.938,1.25) 39(3.938,1.75) 40(3.938,2.25) 41(3.938,2.75) 42(3.938,3.25)
  rrect25% 0.25x0.875 smd: 15(-3.25,-3.938) 16(-2.75,-3.938) 17(-2.25,-3.938) 18(-1.75,-3.938) 19(-1.25,-3.938) 20(-0.75,-3.938) 21(-0.25,-3.938) 22(0.25,-3.938) 23(0.75,-3.938) 24(1.25,-3.938) 25(1.75,-3.938) 26(2.25,-3.938) 27(2.75,-3.938) 28(3.25,-3.938) 43(3.25,3.938) 44(2.75,3.938) 45(2.25,3.938) 46(1.75,3.938) 47(1.25,3.938) 48(0.75,3.938) 49(0.25,3.938) 50(-0.25,3.938) 51(-0.75,3.938) 52(-1.25,3.938) 53(-1.75,3.938) 54(-2.25,3.938) 55(-2.75,3.938) 56(-3.25,3.938)
  rect 5.6x5.6 smd: 57(0,0)
  rrect22% 1.13x1.13 on Top Paste: Un1(-2.1,-2.1) Un2(-0.7,2.1) Un3(-0.7,0.7) Un4(0.7,-2.1) Un5(2.1,-2.1) Un6(-2.1,2.1) Un7(2.1,2.1) Un8(-0.7,-2.1) Un9(-2.1,0.7) Un10(0.7,-0.7) Un11(2.1,-0.7) Un12(0.7,0.7) Un13(2.1,0.7) Un14(-2.1,-0.7) Un15(0.7,2.1) Un16(-0.7,-0.7)
F.SilkS:
  lines w0.12: -4.11,-3.635 -4.11,-4.11 -3.635,-4.11 ; -4.11,4.11 -3.635,4.11 ; 3.635,-4.11 4.11,-4.11 4.11,-3.635 ; 3.635,4.11 4.11,4.11 4.11,3.635
F.CrtYd:
  lines w0.05: -4.62,-4.62 -4.62,4.62 4.62,4.62 4.62,-4.62 -4.62,-4.62
F.Fab:
  lines w0.1: -4,-4 4,-4 4,4 -3,4 -4,3 -4,-4
  text "'.Designator'" at -4.047,-0.84 h1

## QFN-56-1EP_8x8mm_P0.5mm_EP5.6x5.6mm_ThermalVias [mm]
pads (99):
  rrect25% 0.875x0.25 smd: 1(-3.938,3.25) 2(-3.938,2.75) 3(-3.938,2.25) 4(-3.938,1.75) 5(-3.938,1.25) 6(-3.938,0.75) 7(-3.938,0.25) 8(-3.938,-0.25) 9(-3.938,-0.75) 10(-3.938,-1.25) 11(-3.938,-1.75) 12(-3.938,-2.25) 13(-3.938,-2.75) 14(-3.938,-3.25) 29(3.938,-3.25) 30(3.938,-2.75) 31(3.938,-2.25) 32(3.938,-1.75) 33(3.938,-1.25) 34(3.938,-0.75) 35(3.938,-0.25) 36(3.938,0.25) 37(3.938,0.75) 38(3.938,1.25) 39(3.938,1.75) 40(3.938,2.25) 41(3.938,2.75) 42(3.938,3.25)
  rrect25% 0.25x0.875 smd: 15(-3.25,-3.938) 16(-2.75,-3.938) 17(-2.25,-3.938) 18(-1.75,-3.938) 19(-1.25,-3.938) 20(-0.75,-3.938) 21(-0.25,-3.938) 22(0.25,-3.938) 23(0.75,-3.938) 24(1.25,-3.938) 25(1.75,-3.938) 26(2.25,-3.938) 27(2.75,-3.938) 28(3.25,-3.938) 43(3.25,3.938) 44(2.75,3.938) 45(2.25,3.938) 46(1.75,3.938) 47(1.25,3.938) 48(0.75,3.938) 49(0.25,3.938) 50(-0.25,3.938) 51(-0.75,3.938) 52(-1.25,3.938) 53(-1.75,3.938) 54(-2.25,3.938) 55(-2.75,3.938) 56(-3.25,3.938)
  round 0.5 hole 0.2: 57(-2.55,-2.55) 57(-2.55,-1.275) 57(-2.55,0) 57(-2.55,1.275) 57(-2.55,2.55) 57(-1.275,-2.55) 57(-1.275,-1.275) 57(-1.275,0) 57(-1.275,1.275) 57(-1.275,2.55) 57(0,-2.55) 57(0,-1.275) 57(0,0) 57(0,1.275) 57(0,2.55) 57(1.275,-2.55) 57(1.275,-1.275) 57(1.275,0) 57(1.275,1.275) 57(1.275,2.55) 57(2.55,-2.55) 57(2.55,-1.275) 57(2.55,0) 57(2.55,1.275) 57(2.55,2.55)
  rect 5.6x5.6 smd: 57(0,0)
  rect 5.6x5.6 smd far side: 57(0,0)
  rrect23% 1.084x1.084 on Top Paste: Un1(1.913,1.913) Un2(-0.637,1.913) Un3(0.637,-1.913) Un4(-0.637,-0.637) Un5(0.637,1.913) Un6(-1.913,0.637) Un7(0.637,-0.637) Un8(1.913,-1.913) Un9(-1.913,-1.913) Un10(0.637,0.637) Un11(1.913,-0.637) Un12(-0.637,-1.913) Un13(-1.913,-0.637) Un14(1.913,0.637) Un15(-1.913,1.913) Un16(-0.637,0.637)
F.SilkS:
  lines w0.12: -4.11,-3.635 -4.11,-4.11 -3.635,-4.11 ; -4.11,4.11 -3.635,4.11 ; 3.635,-4.11 4.11,-4.11 4.11,-3.635 ; 3.635,4.11 4.11,4.11 4.11,3.635
F.CrtYd:
  lines w0.05: -4.62,-4.62 4.62,-4.62 4.62,4.62 -4.62,4.62 -4.62,-4.62
F.Fab:
  lines w0.1: -4,-4 -4,3 -3,4 4,4 4,-4 -4,-4
  text "'.Designator'" at -4.047,-0.84 h1

## QFN-56-1EP_8x8mm_P0.5mm_EP5.9x5.9mm [mm]
pads (73):
  rrect25% 0.875x0.25 smd: 1(-3.938,3.25) 2(-3.938,2.75) 3(-3.938,2.25) 4(-3.938,1.75) 5(-3.938,1.25) 6(-3.938,0.75) 7(-3.938,0.25) 8(-3.938,-0.25) 9(-3.938,-0.75) 10(-3.938,-1.25) 11(-3.938,-1.75) 12(-3.938,-2.25) 13(-3.938,-2.75) 14(-3.938,-3.25) 29(3.938,-3.25) 30(3.938,-2.75) 31(3.938,-2.25) 32(3.938,-1.75) 33(3.938,-1.25) 34(3.938,-0.75) 35(3.938,-0.25) 36(3.938,0.25) 37(3.938,0.75) 38(3.938,1.25) 39(3.938,1.75) 40(3.938,2.25) 41(3.938,2.75) 42(3.938,3.25)
  rrect25% 0.25x0.875 smd: 15(-3.25,-3.938) 16(-2.75,-3.938) 17(-2.25,-3.938) 18(-1.75,-3.938) 19(-1.25,-3.938) 20(-0.75,-3.938) 21(-0.25,-3.938) 22(0.25,-3.938) 23(0.75,-3.938) 24(1.25,-3.938) 25(1.75,-3.938) 26(2.25,-3.938) 27(2.75,-3.938) 28(3.25,-3.938) 43(3.25,3.938) 44(2.75,3.938) 45(2.25,3.938) 46(1.75,3.938) 47(1.25,3.938) 48(0.75,3.938) 49(0.25,3.938) 50(-0.25,3.938) 51(-0.75,3.938) 52(-1.25,3.938) 53(-1.75,3.938) 54(-2.25,3.938) 55(-2.75,3.938) 56(-3.25,3.938)
  rect 5.9x5.9 smd: 57(0,0)
  rrect21% 1.19x1.19 on Top Paste: Un1(0.74,2.22) Un2(-2.22,-0.74) Un3(-0.74,-2.22) Un4(-0.74,2.22) Un5(2.22,-0.74) Un6(-2.22,0.74) Un7(0.74,-0.74) Un8(2.22,2.22) Un9(-0.74,-0.74) Un10(-2.22,2.22) Un11(-0.74,0.74) Un12(0.74,0.74) Un13(-2.22,-2.22) Un14(2.22,0.74) Un15(0.74,-2.22) Un16(2.22,-2.22)
F.SilkS:
  lines w0.12: -4.11,-3.635 -4.11,-4.11 -3.635,-4.11 ; -4.11,4.11 -3.635,4.11 ; 3.635,-4.11 4.11,-4.11 4.11,-3.635 ; 3.635,4.11 4.11,4.11 4.11,3.635
F.CrtYd:
  lines w0.05: -4.62,-4.62 4.62,-4.62 4.62,4.62 -4.62,4.62 -4.62,-4.62
F.Fab:
  lines w0.1: -4,-4 4,-4 4,4 -3,4 -4,3 -4,-4
  text "'.Designator'" at -4.047,-0.84 h1

## QFN-56-1EP_8x8mm_P0.5mm_EP5.9x5.9mm_ThermalVias [mm]
pads (99):
  rrect25% 0.875x0.25 smd: 1(-3.938,3.25) 2(-3.938,2.75) 3(-3.938,2.25) 4(-3.938,1.75) 5(-3.938,1.25) 6(-3.938,0.75) 7(-3.938,0.25) 8(-3.938,-0.25) 9(-3.938,-0.75) 10(-3.938,-1.25) 11(-3.938,-1.75) 12(-3.938,-2.25) 13(-3.938,-2.75) 14(-3.938,-3.25) 29(3.938,-3.25) 30(3.938,-2.75) 31(3.938,-2.25) 32(3.938,-1.75) 33(3.938,-1.25) 34(3.938,-0.75) 35(3.938,-0.25) 36(3.938,0.25) 37(3.938,0.75) 38(3.938,1.25) 39(3.938,1.75) 40(3.938,2.25) 41(3.938,2.75) 42(3.938,3.25)
  rrect25% 0.25x0.875 smd: 15(-3.25,-3.938) 16(-2.75,-3.938) 17(-2.25,-3.938) 18(-1.75,-3.938) 19(-1.25,-3.938) 20(-0.75,-3.938) 21(-0.25,-3.938) 22(0.25,-3.938) 23(0.75,-3.938) 24(1.25,-3.938) 25(1.75,-3.938) 26(2.25,-3.938) 27(2.75,-3.938) 28(3.25,-3.938) 43(3.25,3.938) 44(2.75,3.938) 45(2.25,3.938) 46(1.75,3.938) 47(1.25,3.938) 48(0.75,3.938) 49(0.25,3.938) 50(-0.25,3.938) 51(-0.75,3.938) 52(-1.25,3.938) 53(-1.75,3.938) 54(-2.25,3.938) 55(-2.75,3.938) 56(-3.25,3.938)
  round 0.5 hole 0.2: 57(-2.7,-2.7) 57(-2.7,-1.35) 57(-2.7,0) 57(-2.7,1.35) 57(-2.7,2.7) 57(-1.35,-2.7) 57(-1.35,-1.35) 57(-1.35,0) 57(-1.35,1.35) 57(-1.35,2.7) 57(0,-2.7) 57(0,-1.35) 57(0,0) 57(0,1.35) 57(0,2.7) 57(1.35,-2.7) 57(1.35,-1.35) 57(1.35,0) 57(1.35,1.35) 57(1.35,2.7) 57(2.7,-2.7) 57(2.7,-1.35) 57(2.7,0) 57(2.7,1.35) 57(2.7,2.7)
  rect 5.9x5.9 smd far side: 57(0,0)
  rect 5.9x5.9 smd: 57(0,0)
  rrect22% 1.143x1.143 on Top Paste: Un1(-2.025,-2.025) Un2(2.025,0.675) Un3(-0.675,-2.025) Un4(-0.675,2.025) Un5(2.025,-0.675) Un6(2.025,2.025) Un7(0.675,-0.675) Un8(0.675,2.025) Un9(-2.025,-0.675) Un10(2.025,-2.025) Un11(0.675,-2.025) Un12(0.675,0.675) Un13(-2.025,0.675) Un14(-2.025,2.025) Un15(-0.675,0.675) Un16(-0.675,-0.675)
F.SilkS:
  lines w0.12: -4.11,-3.635 -4.11,-4.11 -3.635,-4.11 ; -4.11,4.11 -3.635,4.11 ; 3.635,-4.11 4.11,-4.11 4.11,-3.635 ; 3.635,4.11 4.11,4.11 4.11,3.635
F.CrtYd:
  lines w0.05: -4.62,-4.62 4.62,-4.62 4.62,4.62 -4.62,4.62 -4.62,-4.62
F.Fab:
  lines w0.1: -4,-4 -4,3 -3,4 4,4 4,-4 -4,-4
  text "'.Designator'" at -4.047,-0.84 h1

## QFN-64-1EP_8x8mm_P0.4mm_EP6.5x6.5mm [mm]
pads (90):
  rrect25% 0.8x0.2 smd: 1(-3.95,3) 2(-3.95,2.6) 3(-3.95,2.2) 4(-3.95,1.8) 5(-3.95,1.4) 6(-3.95,1) 7(-3.95,0.6) 8(-3.95,0.2) 9(-3.95,-0.2) 10(-3.95,-0.6) 11(-3.95,-1) 12(-3.95,-1.4) 13(-3.95,-1.8) 14(-3.95,-2.2) 15(-3.95,-2.6) 16(-3.95,-3) 33(3.95,-3) 34(3.95,-2.6) 35(3.95,-2.2) 36(3.95,-1.8) 37(3.95,-1.4) 38(3.95,-1) 39(3.95,-0.6) 40(3.95,-0.2) 41(3.95,0.2) 42(3.95,0.6) 43(3.95,1) 44(3.95,1.4) 45(3.95,1.8) 46(3.95,2.2) 47(3.95,2.6) 48(3.95,3)
  rrect25% 0.2x0.8 smd: 17(-3,-3.95) 18(-2.6,-3.95) 19(-2.2,-3.95) 20(-1.8,-3.95) 21(-1.4,-3.95) 22(-1,-3.95) 23(-0.6,-3.95) 24(-0.2,-3.95) 25(0.2,-3.95) 26(0.6,-3.95) 27(1,-3.95) 28(1.4,-3.95) 29(1.8,-3.95) 30(2.2,-3.95) 31(2.6,-3.95) 32(3,-3.95) 49(3,3.95) 50(2.6,3.95) 51(2.2,3.95) 52(1.8,3.95) 53(1.4,3.95) 54(1,3.95) 55(0.6,3.95) 56(0.2,3.95) 57(-0.2,3.95) 58(-0.6,3.95) 59(-1,3.95) 60(-1.4,3.95) 61(-1.8,3.95) 62(-2.2,3.95) 63(-2.6,3.95) 64(-3,3.95)
  rect 6.5x6.5 smd: 65(0,0)
  rrect24% 1.05x1.05 on Top Paste: Un1(2.6,0) Un2(-2.6,2.6) Un3(-1.3,-1.3) Un4(0,1.3) Un5(1.3,0) Un6(-2.6,-2.6) Un7(1.3,1.3) Un8(-2.6,-1.3) Un9(-1.3,2.6) Un10(-2.6,0) Un11(0,2.6) Un12(-1.3,0) Un13(-1.3,-2.6) Un14(0,-1.3) Un15(1.3,-2.6) Un16(2.6,-1.3) Un17(-1.3,1.3) Un18(2.6,2.6) Un19(1.3,2.6) Un20(-2.6,1.3) Un21(2.6,-2.6) Un22(1.3,-1.3) Un23(0,0) Un24(2.6,1.3) Un25(0,-2.6)
F.SilkS:
  lines w0.12: -4.11,-3.36 -4.11,-4.11 -3.36,-4.11 ; -4.11,4.11 -3.36,4.11 ; 3.36,-4.11 4.11,-4.11 4.11,-3.36 ; 3.36,4.11 4.11,4.11 4.11,3.36
F.CrtYd:
  lines w0.05: -4.6,-4.6 4.6,-4.6 4.6,4.6 -4.6,4.6 -4.6,-4.6
F.Fab:
  lines w0.1: -4,-4 -4,3 -3,4 4,4 4,-4 -4,-4
  text "'.Designator'" at -4.047,-0.84 h1